# Altium footprint library chipfc_libs.PCBLIB: 391 footprints (part 21 of 25)
Each footprint in its own frame and in the unit in brackets; x right, y up, seen from the top. Pads: shape width x height; smd on the part's side, far side on the other; paste and mask are expansions set on the pad; w line width, h text height; cw(c..) or ccw(c..) is an arc to the next point about the centre after c.
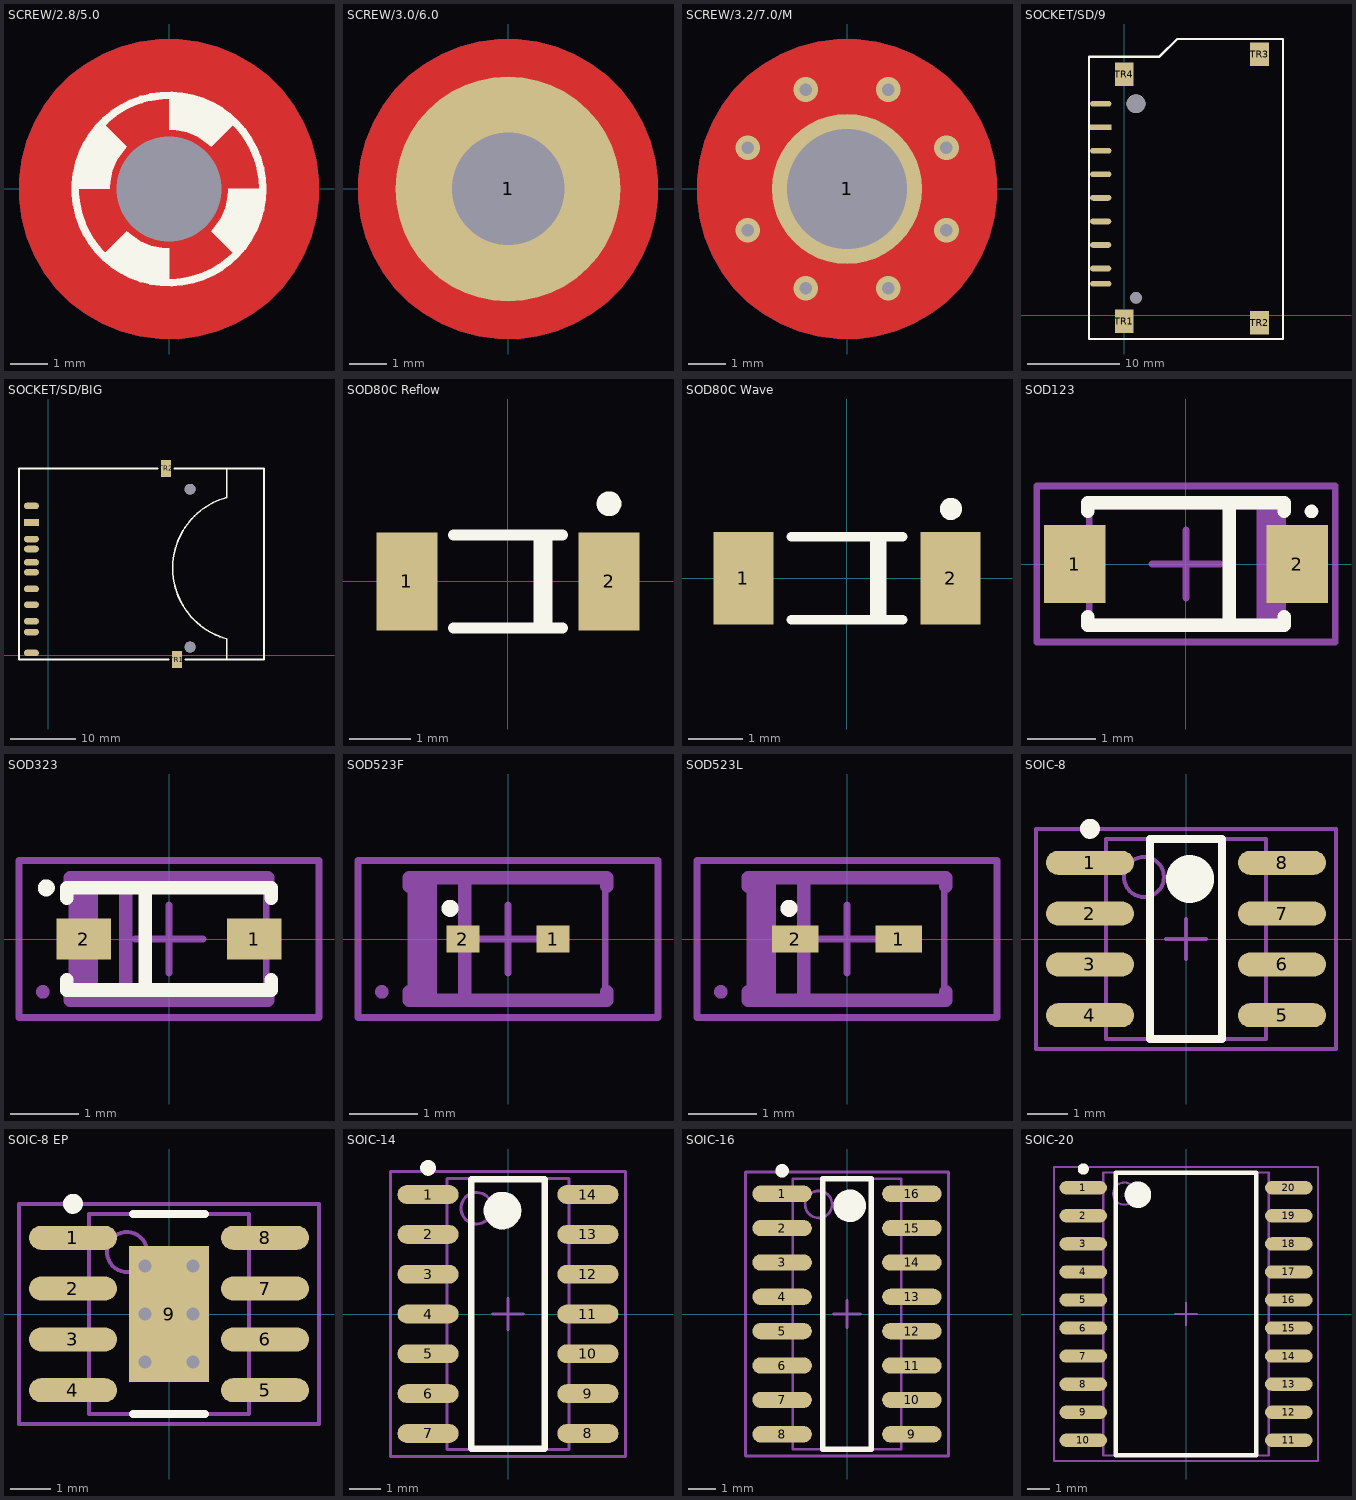
[diagram p20: the footprints below, top view; thin cyan lines are the x and y axes]

## SCREW/2.8/5.0 [mm]
pads (1):
  round 0 hole 2.8 unplated: 1(0,0)
Top Layer:
  pour cut-out: -4,0 -4,0.262 -3.932,0.782 -3.796,1.289 -3.595,1.773 -3.333,2.227 -3.014,2.643 -2.643,3.014 -2.227,3.333 -1.773,3.595 -1.289,3.796 -0.782,3.931 -0.262,4 0,4 0.262,4 0.782,3.932 1.288,3.796 1.773,3.595 2.227,3.333 2.643,3.014 3.014,2.643 3.333,2.227 3.595,1.773 3.796,1.288 3.932,0.782 4,0.262 4,0 4,-0.262 3.932,-0.782 3.796,-1.289 3.595,-1.773 3.333,-2.227 3.014,-2.643 2.643,-3.014 2.227,-3.333 1.773,-3.595 1.289,-3.796 0.782,-3.932 0.262,-4 0,-4 -0.262,-4 -0.782,-3.932 -1.288,-3.796 -1.773,-3.595 -2.227,-3.333 -2.643,-3.014 -3.014,-2.643 -3.333,-2.227 -3.595,-1.773 -3.796,-1.289 -3.932,-0.782 -4,-0.262
Bottom Layer:
  pour cut-out: -4,0 -4,0.262 -3.932,0.782 -3.796,1.289 -3.595,1.773 -3.333,2.227 -3.014,2.643 -2.643,3.014 -2.227,3.333 -1.773,3.595 -1.289,3.796 -0.782,3.931 -0.262,4 0,4 0.262,4 0.782,3.932 1.288,3.796 1.773,3.595 2.227,3.333 2.643,3.014 3.014,2.643 3.333,2.227 3.595,1.773 3.796,1.288 3.932,0.782 4,0.262 4,0 4,-0.262 3.932,-0.782 3.796,-1.289 3.595,-1.773 3.333,-2.227 3.014,-2.643 2.643,-3.014 2.227,-3.333 1.773,-3.595 1.289,-3.796 0.782,-3.932 0.262,-4 0,-4 -0.262,-4 -0.782,-3.932 -1.288,-3.796 -1.773,-3.595 -2.227,-3.333 -2.643,-3.014 -3.014,-2.643 -3.333,-2.227 -3.595,-1.773 -3.796,-1.289 -3.932,-0.782 -4,-0.262
Top Overlay:
  circle w0.203: c0,0 r2.5
  region: 2.5,0 2.5,-0.025 2.5,-0.268 2.405,-0.747 2.218,-1.197 1.947,-1.603 1.775,-1.775 1.125,-1.125 1.226,-1.013 1.394,-0.763 1.509,-0.485 1.568,-0.189 1.575,-0.039 1.575,0
  region: 0,-2.5 -0.025,-2.5 -0.268,-2.5 -0.747,-2.405 -1.197,-2.218 -1.603,-1.947 -1.775,-1.775 -1.125,-1.125 -1.013,-1.226 -0.763,-1.394 -0.485,-1.509 -0.189,-1.568 -0.039,-1.575 0,-1.575
  region: -2.5,0 -2.5,0.025 -2.5,0.268 -2.405,0.747 -2.218,1.197 -1.947,1.603 -1.775,1.775 -1.125,1.125 -1.226,1.013 -1.394,0.763 -1.509,0.485 -1.568,0.189 -1.575,0.039 -1.575,0
  region: 0,2.5 0.025,2.5 0.268,2.5 0.747,2.405 1.197,2.218 1.603,1.947 1.775,1.775 1.125,1.125 1.013,1.226 0.763,1.394 0.485,1.509 0.189,1.568 0.039,1.575 0,1.575
Bottom Overlay:
  circle w0.203: c0,0 r2.5
  region: -2.5,0 -2.5,-0.025 -2.5,-0.268 -2.405,-0.747 -2.218,-1.197 -1.947,-1.603 -1.775,-1.775 -1.125,-1.125 -1.226,-1.013 -1.394,-0.763 -1.509,-0.485 -1.568,-0.189 -1.575,-0.039 -1.575,0
  region: 0,2.5 -0.025,2.5 -0.268,2.5 -0.747,2.405 -1.197,2.218 -1.603,1.947 -1.775,1.775 -1.125,1.125 -1.013,1.226 -0.763,1.394 -0.485,1.509 -0.189,1.568 -0.039,1.575 0,1.575
  region: 2.5,0 2.5,0.025 2.5,0.268 2.405,0.747 2.218,1.197 1.947,1.603 1.775,1.775 1.125,1.125 1.226,1.013 1.394,0.763 1.509,0.485 1.568,0.189 1.575,0.039 1.575,0
  region: 0,-2.5 0.025,-2.5 0.268,-2.5 0.747,-2.405 1.197,-2.218 1.603,-1.947 1.775,-1.775 1.125,-1.125 1.013,-1.226 0.763,-1.394 0.485,-1.509 0.189,-1.568 0.039,-1.575 0,-1.575

## SCREW/3.0/6.0 [mm]
pads (1):
  round 6 hole 3: 1(0,0)
Top Layer:
  pour cut-out: -4,0 -4,0.262 -3.932,0.782 -3.796,1.289 -3.595,1.773 -3.333,2.227 -3.014,2.643 -2.643,3.014 -2.227,3.333 -1.773,3.595 -1.289,3.796 -0.782,3.931 -0.262,4 0,4 0.262,4 0.782,3.932 1.288,3.796 1.773,3.595 2.227,3.333 2.643,3.014 3.014,2.643 3.333,2.227 3.595,1.773 3.796,1.288 3.932,0.782 4,0.262 4,0 4,-0.262 3.932,-0.782 3.796,-1.289 3.595,-1.773 3.333,-2.227 3.014,-2.643 2.643,-3.014 2.227,-3.333 1.773,-3.595 1.289,-3.796 0.782,-3.932 0.262,-4 0,-4 -0.262,-4 -0.782,-3.932 -1.288,-3.796 -1.773,-3.595 -2.227,-3.333 -2.643,-3.014 -3.014,-2.643 -3.333,-2.227 -3.595,-1.773 -3.796,-1.289 -3.932,-0.782 -4,-0.262
Bottom Layer:
  pour cut-out: -4,0 -4,0.262 -3.932,0.782 -3.796,1.289 -3.595,1.773 -3.333,2.227 -3.014,2.643 -2.643,3.014 -2.227,3.333 -1.773,3.595 -1.289,3.796 -0.782,3.931 -0.262,4 0,4 0.262,4 0.782,3.932 1.288,3.796 1.773,3.595 2.227,3.333 2.643,3.014 3.014,2.643 3.333,2.227 3.595,1.773 3.796,1.288 3.932,0.782 4,0.262 4,0 4,-0.262 3.932,-0.782 3.796,-1.289 3.595,-1.773 3.333,-2.227 3.014,-2.643 2.643,-3.014 2.227,-3.333 1.773,-3.595 1.289,-3.796 0.782,-3.932 0.262,-4 0,-4 -0.262,-4 -0.782,-3.932 -1.288,-3.796 -1.773,-3.595 -2.227,-3.333 -2.643,-3.014 -3.014,-2.643 -3.333,-2.227 -3.595,-1.773 -3.796,-1.289 -3.932,-0.782 -4,-0.262

## SCREW/3.2/7.0/M [mm]
pads (1):
  round 4 / inner round 7 / far side round 7 hole 3.2: 1(0,0)
via -1.1,-2.65 diameter 0.66 hole 0.33
via 2.65,-1.1 diameter 0.66 hole 0.33
via 1.1,2.65 diameter 0.66 hole 0.33
via -2.65,1.1 diameter 0.66 hole 0.33
via 2.65,1.1 diameter 0.66 hole 0.33
via -1.1,2.65 diameter 0.66 hole 0.33
via -2.65,-1.1 diameter 0.66 hole 0.33
via 1.1,-2.65 diameter 0.66 hole 0.33
Top Layer:
  pour cut-out: -4,0 -4,0.262 -3.932,0.782 -3.796,1.289 -3.595,1.773 -3.333,2.227 -3.014,2.643 -2.643,3.014 -2.227,3.333 -1.773,3.595 -1.289,3.796 -0.782,3.931 -0.262,4 0,4 0.262,4 0.782,3.932 1.288,3.796 1.773,3.595 2.227,3.333 2.643,3.014 3.014,2.643 3.333,2.227 3.595,1.773 3.796,1.288 3.932,0.782 4,0.262 4,0 4,-0.262 3.932,-0.782 3.796,-1.289 3.595,-1.773 3.333,-2.227 3.014,-2.643 2.643,-3.014 2.227,-3.333 1.773,-3.595 1.289,-3.796 0.782,-3.932 0.262,-4 0,-4 -0.262,-4 -0.782,-3.932 -1.288,-3.796 -1.773,-3.595 -2.227,-3.333 -2.643,-3.014 -3.014,-2.643 -3.333,-2.227 -3.595,-1.773 -3.796,-1.289 -3.932,-0.782 -4,-0.262
  region: -0.1,-2.25 -0.325,-2.225 -0.575,-2.175 -0.8,-2.1 -0.975,-2.025 -1.125,-1.95 -1.25,-1.875 -1.375,-1.775 -1.5,-1.675 -2.425,-2.6 -2.225,-2.775 -2.025,-2.925 -1.825,-3.05 -1.6,-3.175 -1.375,-3.275 -1.175,-3.35 -0.95,-3.425 -0.725,-3.475 -0.6,-3.5 -0.45,-3.525 -0.1,-3.55
  region: 0.1,-2.25 0.325,-2.225 0.575,-2.175 0.8,-2.1 0.975,-2.025 1.125,-1.95 1.25,-1.875 1.375,-1.775 1.5,-1.675 2.425,-2.6 2.225,-2.775 2.025,-2.925 1.825,-3.05 1.6,-3.175 1.375,-3.275 1.175,-3.35 0.95,-3.425 0.725,-3.475 0.6,-3.5 0.45,-3.525 0.1,-3.55
  region: 2.25,0.1 2.225,0.325 2.175,0.575 2.1,0.8 2.025,0.975 1.95,1.125 1.875,1.25 1.775,1.375 1.675,1.5 2.6,2.425 2.775,2.225 2.925,2.025 3.05,1.825 3.175,1.6 3.275,1.375 3.35,1.175 3.425,0.95 3.475,0.725 3.5,0.6 3.525,0.45 3.55,0.1
  region: 2.25,-0.1 2.225,-0.325 2.175,-0.575 2.1,-0.8 2.025,-0.975 1.95,-1.125 1.875,-1.25 1.775,-1.375 1.675,-1.5 2.6,-2.425 2.775,-2.225 2.925,-2.025 3.05,-1.825 3.175,-1.6 3.275,-1.375 3.35,-1.175 3.425,-0.95 3.475,-0.725 3.5,-0.6 3.525,-0.45 3.55,-0.1
  region: 0.1,2.25 0.325,2.225 0.575,2.175 0.8,2.1 0.975,2.025 1.125,1.95 1.25,1.875 1.375,1.775 1.5,1.675 2.425,2.6 2.225,2.775 2.025,2.925 1.825,3.05 1.6,3.175 1.375,3.275 1.175,3.35 0.95,3.425 0.725,3.475 0.6,3.5 0.45,3.525 0.1,3.55
  region: -0.1,2.25 -0.325,2.225 -0.575,2.175 -0.8,2.1 -0.975,2.025 -1.125,1.95 -1.25,1.875 -1.375,1.775 -1.5,1.675 -2.425,2.6 -2.225,2.775 -2.025,2.925 -1.825,3.05 -1.6,3.175 -1.375,3.275 -1.175,3.35 -0.95,3.425 -0.725,3.475 -0.6,3.5 -0.45,3.525 -0.1,3.55
  region: -2.25,-0.1 -2.225,-0.325 -2.175,-0.575 -2.1,-0.8 -2.025,-0.975 -1.95,-1.125 -1.875,-1.25 -1.775,-1.375 -1.675,-1.5 -2.6,-2.425 -2.775,-2.225 -2.925,-2.025 -3.05,-1.825 -3.175,-1.6 -3.275,-1.375 -3.35,-1.175 -3.425,-0.95 -3.475,-0.725 -3.5,-0.6 -3.525,-0.45 -3.55,-0.1
  region: -2.25,0.1 -2.225,0.325 -2.175,0.575 -2.1,0.8 -2.025,0.975 -1.95,1.125 -1.875,1.25 -1.775,1.375 -1.675,1.5 -2.6,2.425 -2.775,2.225 -2.925,2.025 -3.05,1.825 -3.175,1.6 -3.275,1.375 -3.35,1.175 -3.425,0.95 -3.475,0.725 -3.5,0.6 -3.525,0.45 -3.55,0.1
Bottom Layer:
  pour cut-out: -4,0 -4,0.262 -3.932,0.782 -3.796,1.289 -3.595,1.773 -3.333,2.227 -3.014,2.643 -2.643,3.014 -2.227,3.333 -1.773,3.595 -1.289,3.796 -0.782,3.931 -0.262,4 0,4 0.262,4 0.782,3.932 1.288,3.796 1.773,3.595 2.227,3.333 2.643,3.014 3.014,2.643 3.333,2.227 3.595,1.773 3.796,1.288 3.932,0.782 4,0.262 4,0 4,-0.262 3.932,-0.782 3.796,-1.289 3.595,-1.773 3.333,-2.227 3.014,-2.643 2.643,-3.014 2.227,-3.333 1.773,-3.595 1.289,-3.796 0.782,-3.932 0.262,-4 0,-4 -0.262,-4 -0.782,-3.932 -1.288,-3.796 -1.773,-3.595 -2.227,-3.333 -2.643,-3.014 -3.014,-2.643 -3.333,-2.227 -3.595,-1.773 -3.796,-1.289 -3.932,-0.782 -4,-0.262
Top Solder:
  region: 3.6,-0.017 3.6,-0.252 3.539,-0.717 3.417,-1.171 3.237,-1.605 3.003,-2.012 2.717,-2.384 2.385,-2.717 2.012,-3.003 1.605,-3.237 1.171,-3.417 0.717,-3.539 0.252,-3.6 0.017,-3.6 -0.22,-3.6 -0.69,-3.538 -1.148,-3.416 -1.586,-3.234 -1.997,-2.997 -2.373,-2.709 -2.708,-2.374 -2.997,-1.997 -3.234,-1.587 -3.415,-1.149 -3.538,-0.691 -3.6,-0.221 -3.6,0.016 -3.6,0.252 -3.538,0.719 -3.416,1.174 -3.235,1.609 -2.999,2.017 -2.711,2.39 -2.377,2.722 -2.003,3.008 -1.594,3.243 -1.158,3.421 -0.702,3.542 -0.235,3.601 0.001,3.6 0.237,3.599 0.706,3.535 1.162,3.411 1.598,3.228 2.006,2.991 2.38,2.702 2.714,2.367 3.001,1.991 3.236,1.582 3.417,1.145 3.539,0.688 3.6,0.219

## SOCKET/SD/9 [mil]
pads (15):
  rect 90x25 smd: 1(-100,800)
  oval 90x25 smd: 2(-100,700) 3(-100,600) 4(-100,500) 5(-100,400) 6(-100,300) 7(-100,200) 8(-100,135) 9(-100,900)
  round 80 / inner round 60 / far side round 80 hole 80: HOLD1(50,900)
  round 50 / inner round 60 / far side round 50 hole 50: HOLD2(50,75)
  rect 80x100 smd: TR1(0,-25) TR2(575,-30) TR3(575,1110) TR4(0,1025)
Top Overlay:
  lines w10: -150,-100 -150,1100 150,1100 225,1175 675,1175 675,-100 -150,-100
  text ".Designator" at 75,662.5 h56.25
Mechanical 1:
  text ".Comment" at 0,225 h56.25
  text ".Designator" at 0,337.5 h56.25
  text ".Pattern" at 0,0 h56.25

## SOCKET/SD/BIG [mil]
pads (15):
  rect 90x40 smd: 1(-100,800)
  oval 90x40 smd: 2(-100,700) 3(-100,560) 4(-100,500) 5(-100,400) 6(-100,305) 7(-100,205) 8(-100,140) 9(-100,900) 10(-100,15) 11(-100,640)
  round 65 / inner round 60 / far side round 65 hole 65: HOLD1(855,50) HOLD2(855,1000)
  rect 60x100 smd: TR1(775,-25) TR2(710,1125)
Top Overlay:
  lines w10: 660,1125 -175,1125 ; 725,-25 -175,-25 ; 760,1125 1300,1125 1300,-25 825,-25 ; 1075,-25 1075,100 cw(c1190.38,525) 1075,950 1075,1125 ; -175,-25 -175,1125 ; -175,-25 700,-25 -175,-25 ; -175,-25 -175,1125 ; -175,-25 -175,1125 ; -175,1125 650,1125 -175,1125
  text ".Designator" at 195,467.5 h56.25

## SOD80C Reflow [mm]
pads (2):
  rect 1x1.6 smd: 1(-1.65,0) 2(1.65,0)
Top Overlay:
  circle w0.203: c1.651,1.27 r0.102
  lines w0.178: -0.889,-0.762 0.889,-0.762 ; -0.889,0.762 0.889,0.762 ; 0.508,-0.762 0.508,0.762 ; 0.635,-0.762 0.635,0.762
3D body "User Library-sod80-1-mini-melf-LL4148.step": height 1.44, standoff -0.01, extent -1.75,-0.725 1.75,0.725

## SOD80C Wave [mm]
pads (2):
  rect 1.1x1.7 smd: 1(-1.9,0) 2(1.9,0)
Top Overlay:
  circle w0.203: c1.905,1.27 r0.102
  lines w0.178: -1.016,-0.762 1.016,-0.762 ; -1.016,0.762 1.016,0.762 ; 0.508,-0.762 0.508,0.762 ; 0.635,-0.762 0.635,0.762
3D body "User Library-sod80-1-mini-melf-LL4148.step": height 1.44, standoff -0.01, extent -1.75,-0.725 1.75,0.725

## SOD123 [mm] "Molded Diode, 2-Leads, Body 2.7x1.6mm, IPC Medium Density"
height 1.35
pads (2):
  rect 0.91x1.143 smd: 1(-1.64,0) 2(1.64,0)
Top Overlay:
  circle w0.1: c1.85,0.775 r0.05
  lines w0.2: -1.45,-0.775 -1.45,-0.9 1.45,-0.9 1.45,-0.775 ; -1.45,0.775 -1.45,0.9 1.45,0.9 1.45,0.775 ; 0.635,-0.889 0.635,0.889
Mechanical 13:
  rectangle: 1.042,-0.85 1.425,0.85
  lines w0.1: -1.425,-0.85 1.425,-0.85 1.425,0.85 -1.425,0.85 -1.425,-0.85
Mechanical 15:
  lines w0.1: -0.5,0 0.5,0 ; 0,-0.5 0,0.5 ; -2.2,-1.15 2.2,-1.15 2.2,1.15 -2.2,1.15 -2.2,-1.15
3D body "User Library-SOD3716X14.step": height 1.35, standoff 0, extent -1.85,-0.775 1.85,0.775

## SOD323 [mm]
pads (2):
  rect 0.8x0.6 smd: 1(1.25,0) 2(-1.25,0)
Top Overlay:
  circle w0.15: c-1.8,0.75 r0.05
  lines w0.2: -1.5,-0.75 -1.5,-0.6 ; -1.5,0.6 -1.5,0.75 1.5,0.75 1.5,0.6 ; -0.35,-0.75 -0.35,0.75 ; 1.5,-0.75 1.5,-0.6
  lines w0.203: -1.5,-0.75 1.5,-0.75
Mechanical 13:
  region: -1.042,0.85 -1.425,0.85 -1.425,-0.85 -1.042,-0.85
  lines w0.1: -1.425,-0.85 1.425,-0.85 1.425,0.85 -1.425,0.85 -1.425,-0.85
Mechanical 15:
  lines w0.1: -0.5,0 0.5,0 ; 0,-0.5 0,0.5 ; -2.2,-1.15 2.2,-1.15 2.2,1.15 -2.2,1.15 -2.2,-1.15
Mechanical 31:
  circle w0.1: c-1.85,-0.775 r0.05
  lines w0.2: -1.45,-0.775 -1.45,-0.9 1.45,-0.9 1.45,-0.775 ; -1.45,0.775 -1.45,0.9 1.45,0.9 1.45,0.775 ; -0.635,-0.889 -0.635,0.889
3D body "User Library-SOD323-1.step": height 1.1, standoff 0, extent -1.3,-0.675 1.3,0.675

## SOD523F [mm]
pads (2):
  rect 0.48x0.4 smd: 1(0.66,0) 2(-0.66,0)
Top Overlay:
  circle w0.15: c-0.85,0.45 r0.05
Mechanical 13:
  region: -1.042,0.85 -1.425,0.85 -1.425,-0.85 -1.042,-0.85
  lines w0.1: -1.425,-0.85 1.425,-0.85 1.425,0.85 -1.425,0.85 -1.425,-0.85
Mechanical 15:
  lines w0.1: -0.5,0 0.5,0 ; 0,-0.5 0,0.5 ; -2.2,-1.15 -2.2,1.15 2.2,1.15 2.2,-1.15 -2.2,-1.15
Mechanical 31:
  circle w0.1: c-1.85,-0.775 r0.05
  lines w0.2: -1.45,-0.775 -1.45,-0.9 1.45,-0.9 1.45,-0.775 ; -1.45,0.775 -1.45,0.9 1.45,0.9 1.45,0.775 ; -0.635,-0.889 -0.635,0.889
3D body "User Library-SOD523F.step": height 0.7, standoff 0, extent -0.85,-0.45 0.85,0.45

## SOD523L [mm]
pads (2):
  rect 0.68x0.4 smd: 1(0.76,0) 2(-0.76,0)
Top Overlay:
  circle w0.15: c-0.85,0.45 r0.05
Mechanical 13:
  region: -1.042,0.85 -1.425,0.85 -1.425,-0.85 -1.042,-0.85
  lines w0.1: -1.425,-0.85 -1.425,0.85 1.425,0.85 1.425,-0.85 -1.425,-0.85
Mechanical 15:
  lines w0.1: -0.5,0 0.5,0 ; 0,-0.5 0,0.5 ; -2.2,-1.15 2.2,-1.15 2.2,1.15 -2.2,1.15 -2.2,-1.15
Mechanical 31:
  circle w0.1: c-1.85,-0.775 r0.05
  lines w0.2: -1.45,-0.775 -1.45,-0.9 1.45,-0.9 1.45,-0.775 ; -1.45,0.775 -1.45,0.9 1.45,0.9 1.45,0.775 ; -0.635,-0.889 -0.635,0.889
3D body "User Library-SOD523F.step": height 0.7, standoff 0, extent -0.85,-0.45 0.85,0.45

## SOIC-8 [mm] "SOIC, 8-Leads, Body 5.0x4.0mm (max), Pitch 1.27mm, IPC Medium Density"
height 1.75
pads (8):
  oval 2.2x0.6 smd: 1(-2.4,1.905) 2(-2.4,0.635) 3(-2.4,-0.635) 4(-2.4,-1.905) 5(2.4,-1.905) 6(2.4,-0.635) 7(2.4,0.635) 8(2.4,1.905)
Top Overlay:
  circle w0.25: c-2.4,2.755 r0.125
  circle w0.6: c0.1,1.5 r0.3
  lines w0.2: -0.9,-2.5 -0.9,2.5 0.9,2.5 0.9,-2.5 -0.9,-2.5
Mechanical 13:
  circle w0.1: c-1.05,1.55 r0.5
  lines w0.1: -2,-2.5 -2,2.5 2,2.5 2,-2.5 -2,-2.5
Mechanical 15:
  lines w0.1: -0.5,0 0.5,0 ; 0,-0.5 0,0.5 ; -3.75,-2.75 -3.75,2.75 3.75,2.75 3.75,-2.75 -3.75,-2.75
3D body "User Library-SOIC-8-1.step": height 1.75, standoff 0, extent -3,-2.487 3,2.413

## SOIC-8 EP [mm] "SOIC, 8-Leads, Body 5.0x4.0mm (max), Pitch 1.27mm, IPC Medium Density"
height 1.75
pads (9):
  oval 2.2x0.6 smd: 1(-2.4,1.905) 2(-2.4,0.635) 3(-2.4,-0.635) 4(-2.4,-1.905) 5(2.4,-1.905) 6(2.4,-0.635) 7(2.4,0.635) 8(2.4,1.905)
  rect 2x3.4 smd: 9(0,0)
via -0.6,1.2 diameter 0.66 hole 0.33
via 0.6,1.2 diameter 0.66 hole 0.33
via -0.6,0 diameter 0.66 hole 0.33
via 0.6,0 diameter 0.66 hole 0.33
via -0.6,-1.2 diameter 0.66 hole 0.33
via 0.6,-1.2 diameter 0.66 hole 0.33
Top Overlay:
  circle w0.25: c-2.4,2.755 r0.125
  lines w0.2: -0.9,-2.5 0.9,-2.5 ; -0.9,2.5 0.9,2.5
Mechanical 13:
  circle w0.1: c-1.05,1.55 r0.5
  lines w0.1: -2,-2.5 -2,2.5 2,2.5 2,-2.5 -2,-2.5
Mechanical 15:
  lines w0.1: -0.5,0 0.5,0 ; 0,-0.5 0,0.5 ; -3.75,-2.75 -3.75,2.75 3.75,2.75 3.75,-2.75 -3.75,-2.75
3D body "User Library-SOIC-8-1.step": height 1.75, standoff 0, extent -3,-2.487 3,2.413

## SOIC-14 [mm] "SOIC, 14-Leads, Body 8.6x3.9mm (max), Pitch 1.27mm, IPC Medium Density"
height 1.75
pads (14):
  oval 1.95x0.6 smd: 1(-2.55,3.81) 2(-2.55,2.54) 3(-2.55,1.27) 4(-2.55,0) 5(-2.55,-1.27) 6(-2.55,-2.54) 7(-2.55,-3.81) 8(2.55,-3.81) 9(2.55,-2.54) 10(2.55,-1.27) 11(2.55,0) 12(2.55,1.27) 13(2.55,2.54) 14(2.55,3.81)
Top Overlay:
  circle w0.6: c-0.175,3.3 r0.3
  circle w0.25: c-2.55,4.66 r0.125
  lines w0.2: -1.175,-4.3 1.175,-4.3 1.175,4.3 -1.175,4.3 -1.175,-4.3
Mechanical 13:
  circle w0.1: c-1,3.375 r0.5
  lines w0.1: -1.95,-4.325 1.95,-4.325 1.95,4.325 -1.95,4.325 -1.95,-4.325
Mechanical 15:
  lines w0.1: -0.5,0 0.5,0 ; 0,-0.5 0,0.5 ; -3.75,-4.55 3.75,-4.55 3.75,4.55 -3.75,4.55 -3.75,-4.55
3D body "SOIC-14.step": height 1.95, standoff 0, extent -3.028,-4.343 3.028,4.357

## SOIC-16 [mm] "SOIC, 16-Leads, Body 10.0x4.0mm (max), Pitch 1.27mm, IPC Medium Density"
height 1.75
pads (16):
  oval 2.2x0.6 smd: 1(-2.4,4.445) 2(-2.4,3.175) 3(-2.4,1.905) 4(-2.4,0.635) 5(-2.4,-0.635) 6(-2.4,-1.905) 7(-2.4,-3.175) 8(-2.4,-4.445) 9(2.4,-4.445) 10(2.4,-3.175) 11(2.4,-1.905) 12(2.4,-0.635) 13(2.4,0.635) 14(2.4,1.905) 15(2.4,3.175) 16(2.4,4.445)
Top Overlay:
  circle w0.25: c-2.4,5.295 r0.125
  circle w0.6: c0.1,4 r0.3
  lines w0.2: -0.9,-5 -0.9,5 0.9,5 0.9,-5 -0.9,-5
Mechanical 13:
  circle w0.1: c-1.05,4.05 r0.5
  lines w0.1: -2,-5 -2,5 2,5 2,-5 -2,-5
Mechanical 15:
  lines w0.1: -0.5,0 0.5,0 ; 0,-0.5 0,0.5 ; -3.75,-5.25 -3.75,5.25 3.75,5.25 3.75,-5.25 -3.75,-5.25
3D body "User Library-SOIC-16-1.step": height 1.4, standoff 0, extent -3,-4.95 3,4.95

## SOIC-20 [mm] "SOIC, 20-Leads, Body 12.8x7.5mm (max), Pitch 1.27mm, IPC Medium Density"
height 2.65
pads (20):
  oval 2.15x0.6 smd: 1(-4.65,5.715) 2(-4.65,4.445) 3(-4.65,3.175) 4(-4.65,1.905) 5(-4.65,0.635) 6(-4.65,-0.635) 7(-4.65,-1.905) 8(-4.65,-3.175) 9(-4.65,-4.445) 10(-4.65,-5.715) 11(4.65,-5.715) 12(4.65,-4.445) 13(4.65,-3.175) 14(4.65,-1.905) 15(4.65,-0.635) 16(4.65,0.635) 17(4.65,1.905) 18(4.65,3.175) 19(4.65,4.445) 20(4.65,5.715)
Top Overlay:
  circle w0.6: c-2.175,5.4 r0.3
  circle w0.25: c-4.65,6.565 r0.125
  lines w0.2: -3.175,-6.4 3.175,-6.4 3.175,6.4 -3.175,6.4 -3.175,-6.4
Mechanical 13:
  circle w0.1: c-2.8,5.45 r0.5
  lines w0.1: -3.75,-6.4 3.75,-6.4 3.75,6.4 -3.75,6.4 -3.75,-6.4
Mechanical 15:
  lines w0.1: -0.5,0 0.5,0 ; 0,-0.5 0,0.5 ; -5.975,-6.65 5.975,-6.65 5.975,6.65 -5.975,6.65 -5.975,-6.65
3D body "SO20.step": height 2.8, standoff 0, extent -5.08,-6.5 5.256,6.5